# Altium footprint library distance_sensor.PcbLib: 25 footprints (part 2 of 2)
Each footprint in its own frame and in the unit in brackets; x right, y up, seen from the top. Pads: shape width x height; smd on the part's side, far side on the other; paste and mask are expansions set on the pad; w line width, h text height; cw(c..) or ccw(c..) is an arc to the next point about the centre after c.
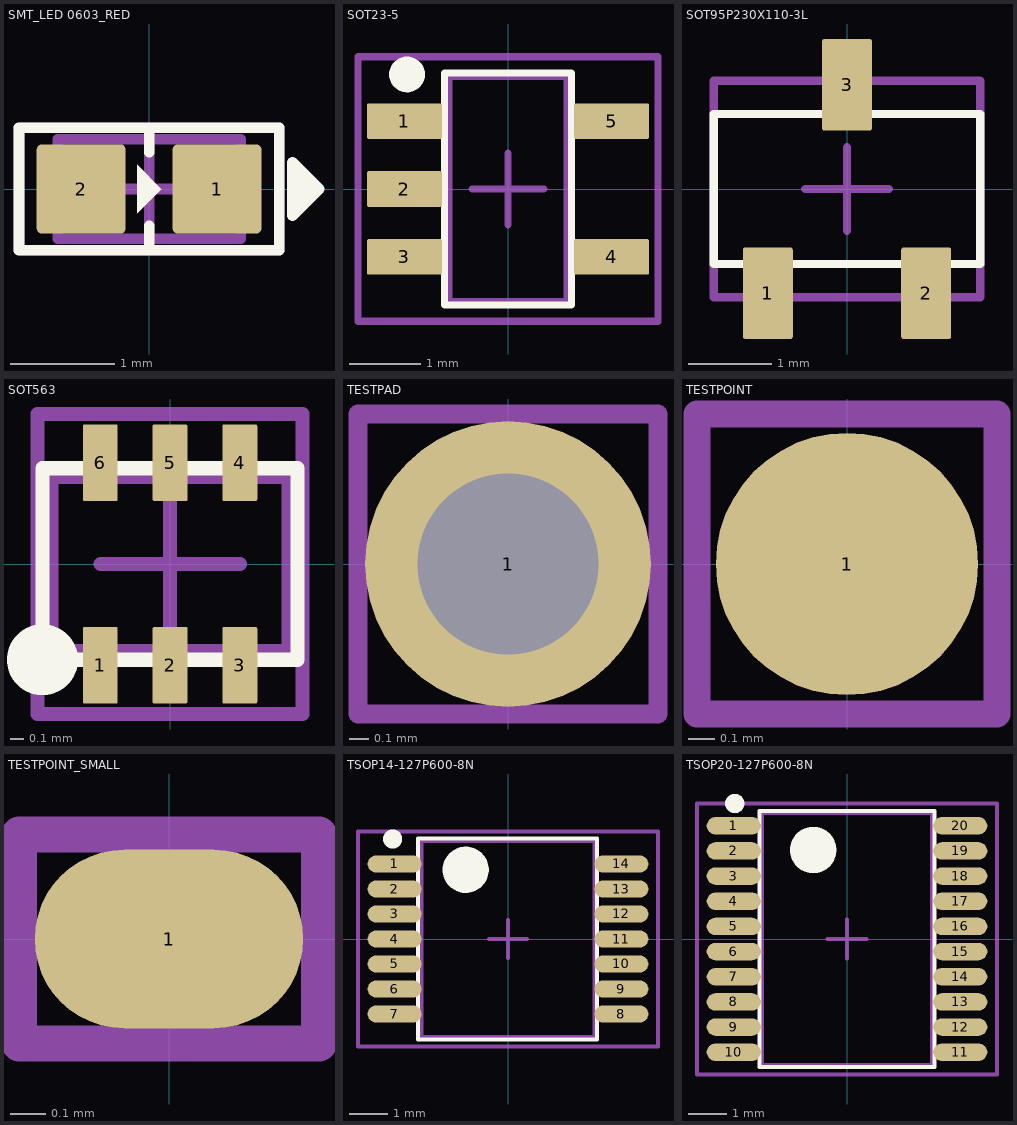
[diagram p1: the footprints below, top view; thin cyan lines are the x and y axes]

## SMT_LED 0603_RED [mm] "Chip Diode, 2-Leads, Body 1.60x0.80mm, IPC Medium Density"
height 0.45
pads (2):
  rrect10% 0.85x0.85 smd: 1(0.65,0) 2(-0.65,0)
Top Overlay:
  region: -0.114,0.231 -0.114,-0.231 0.117,0
  region: -0.114,0.191
  region: 1.372,0.254 1.626,0 1.372,-0.254
  lines w0.102: 0,-0.584 0,-0.35 ; 0,0.35 0,0.584 ; -1.245,-0.584 1.245,-0.584 1.245,0.584 -1.245,0.584 -1.245,-0.584 ; 1.372,-0.254 1.626,0 1.372,0.254 1.372,-0.254
Top Assembly:
  lines w0.1: -0.875,-0.475 0.875,-0.475 0.875,0.475 -0.875,0.475 -0.875,-0.475
Top Courtyard:
  lines w0.102: -0.475,0 0.475,0 ; 0,-0.475 0,0.475 ; -1.245,-0.584 1.245,-0.584 1.245,0.584 -1.245,0.584 -1.245,-0.584
3D body "LED 0603 Base RED.STEP": height 0.28, standoff 0, extent -0.8,-0.4 0.8,0.4
3D body "LED 0603 Lens RED.STEP": height 0.53, standoff 0.18, extent -0.55,-0.4 0.55,0.4

## SOT23-5 [mm] "SOT23, 5-Leads, Body 3.00x2.75mm, Pitch 0.95mm, IPC Medium Density"
height 1
pads (5):
  rrect10% 1.05x0.5 smd: 1(-1.45,0.95) 2(-1.45,0) 3(-1.45,-0.95) 4(1.45,-0.95) 5(1.45,0.95)
Top Overlay:
  circle w0.25: c-1.413,1.603 r0.125
  lines w0.102: -0.889,-1.626 0.889,-1.626 0.889,1.626 -0.889,1.626 -0.889,-1.626
Top Assembly:
  lines w0.102: -0.825,-1.575 -0.825,1.575 0.825,1.575 0.825,-1.575 -0.825,-1.575
Top Courtyard:
  lines w0.1: -0.5,0 0.5,0 ; 0,-0.5 0,0.5
  lines w0.102: -2.1,-1.85 -2.1,1.85 2.1,1.85 2.1,-1.85 -2.1,-1.85
3D body "SOT23-5.step": height 1, standoff 0, extent -1.5,-1.575 1.5,1.575

## SOT95P230X110-3L [mm] "SOT23, 3-Leads, Body 2.90x2.30mm, Pitch 0.95mm, IPC High Density"
height 1.1
pads (3):
  rrect10% 0.6x1.1 smd: 1(-0.95,-1.25) 2(0.95,-1.25) 3(0,1.25)
Top Overlay:
  lines w0.102: -1.6,-0.9 -1.6,0.9 1.6,0.9 1.6,-0.9 -1.6,-0.9
Top Assembly:
  lines w0.1: -1.6,-0.9 1.6,-0.9 1.6,0.9 -1.6,0.9 -1.6,-0.9
Top Courtyard:
  lines w0.102: -0.5,0 0.5,0 ; 0,-0.5 0,0.5 ; -1.6,-1.3 1.6,-1.3 1.6,1.3 -1.6,1.3 -1.6,-1.3
3D body "SOT95P230X110-3L.step": height 1.1, standoff 0, extent -1.5,-1.3 1.5,1.3

## SOT563 [mm] "SOTFL, 6-Leads, Body 1.60x1.63mm, Pitch 0.50mm, IPC High Density"
height 0.6
pads (6):
  rrect10% 0.25x0.55 smd: 1(-0.5,-0.725) 2(0,-0.725) 3(0.5,-0.725) 4(0.5,0.725) 5(0,0.725) 6(-0.5,0.725)
Top Overlay:
  circle w0.406: c-0.914,-0.686 r0.051
  lines w0.102: -0.914,-0.686 -0.914,0.686 0.914,0.686 0.914,-0.686 -0.914,-0.686
Top Assembly:
  lines w0.102: -0.85,-0.625 -0.85,0.625 0.85,0.625 0.85,-0.625 -0.85,-0.625
Top Courtyard:
  lines w0.1: -0.5,0 0.5,0 ; 0,-0.5 0,0.5
  lines w0.102: -0.95,-1.075 -0.95,1.075 0.95,1.075 0.95,-1.075 -0.95,-1.075
3D body "SOT563.step": height 0.6, standoff 0, extent -0.848,-0.812 0.848,0.813

## TESTPAD [mm]
pads (1):
  round 1.5 hole 0.95: 1(0,0)
Top Courtyard:
  lines w0.102: -0.254,0 0.254,0 ; 0,-0.254 0,0.254 ; -0.787,-0.787 0.787,-0.787 0.787,0.787 -0.787,0.787 -0.787,-0.787

## TESTPOINT [mm]
pads (1):
  round 1 smd paste-900: 1(0,0)
Top Overlay:
  text ".TestID" at -1.957,1.016 h0.64
Top Courtyard:
  lines w0.102: -0.191,0 0.191,0 ; 0,-0.191 0,0.191 ; -0.572,-0.572 0.572,-0.572 0.572,0.572 -0.572,0.572 -0.572,-0.572

## TESTPOINT_SMALL [mm]
pads (1):
  oval 0.75x0.5 smd paste-900: 1(0,0)
Top Courtyard:
  region: -0.305,0.229
  lines w0.102: -0.165,0 0.165,0 ; 0,-0.165 0,0.165 ; -0.419,-0.292 0.419,-0.292 0.419,0.292 -0.419,0.292 -0.419,-0.292

## TSOP14-127P600-8N [mm] "TSOP 14"
height 1.2
pads (14):
  oval 1.4x0.45 smd: 1(-2.95,1.95) 2(-2.95,1.3) 3(-2.95,0.65) 4(-2.95,0) 5(-2.95,-0.65) 6(-2.95,-1.3) 7(-2.95,-1.95) 8(2.95,-1.95) 9(2.95,-1.3) 10(2.95,-0.65) 11(2.95,0) 12(2.95,0.65) 13(2.95,1.3) 14(2.95,1.95)
Top Overlay:
  circle w0.6: c-1.1,1.8 r0.3
  circle w0.25: c-3,2.6 r0.125
  lines w0.102: -2.337,-2.616 2.311,-2.616 2.311,2.616 -2.337,2.616 -2.337,-2.616
Top Assembly:
  circle w0.1: c-1.1,1.8 r0.5
  lines w0.102: -2.25,-2.55 2.25,-2.55 2.25,2.55 -2.25,2.55 -2.25,-2.55
Top Courtyard:
  lines w0.1: -0.5,0 0.5,0 ; 0,-0.5 0,0.5
  lines w0.102: -3.9,-2.8 3.9,-2.8 3.9,2.8 -3.9,2.8 -3.9,-2.8
3D body "TSOP14-127P600-8N.step": height 1.2, standoff 0, extent -3.2,-2.55 3.2,2.55

## TSOP20-127P600-8N [mm] "TSOP-20"
height 1.1
pads (20):
  oval 1.4x0.45 smd: 1(-2.925,2.925) 2(-2.925,2.275) 3(-2.925,1.625) 4(-2.925,0.975) 5(-2.925,0.325) 6(-2.925,-0.325) 7(-2.925,-0.975) 8(-2.925,-1.625) 9(-2.925,-2.275) 10(-2.925,-2.925) 11(2.925,-2.925) 12(2.925,-2.275) 13(2.925,-1.625) 14(2.925,-0.975) 15(2.925,-0.325) 16(2.925,0.325) 17(2.925,0.975) 18(2.925,1.625) 19(2.925,2.275) 20(2.925,2.925)
Top Overlay:
  circle w0.6: c-0.874,2.299 r0.3
  circle w0.25: c-2.9,3.5 r0.125
  lines w0.102: -2.261,-3.302 2.261,-3.302 2.261,3.302 -2.261,3.302 -2.261,-3.302
Top Assembly:
  circle w0.1: c-0.874,2.299 r0.5
  lines w0.102: -2.2,-3.25 2.2,-3.25 2.2,3.25 -2.2,3.25 -2.2,-3.25
Top Courtyard:
  lines w0.1: -0.5,0 0.5,0 ; 0,-0.5 0,0.5
  lines w0.102: -3.875,-3.5 3.875,-3.5 3.875,3.5 -3.875,3.5 -3.875,-3.5
3D body "TSOP20-127P600-8N.step": height 1.1, standoff 0, extent -3.2,-3.25 3.2,3.25